# Altium footprint library PCB SOM AM625.PcbLib: 64 footprints (part 1 of 4)
Each footprint in its own frame and in the unit in brackets; x right, y up, seen from the top. Pads: shape width x height; smd on the part's side, far side on the other; paste and mask are expansions set on the pad; w line width, h text height; cw(c..) or ccw(c..) is an arc to the next point about the centre after c.
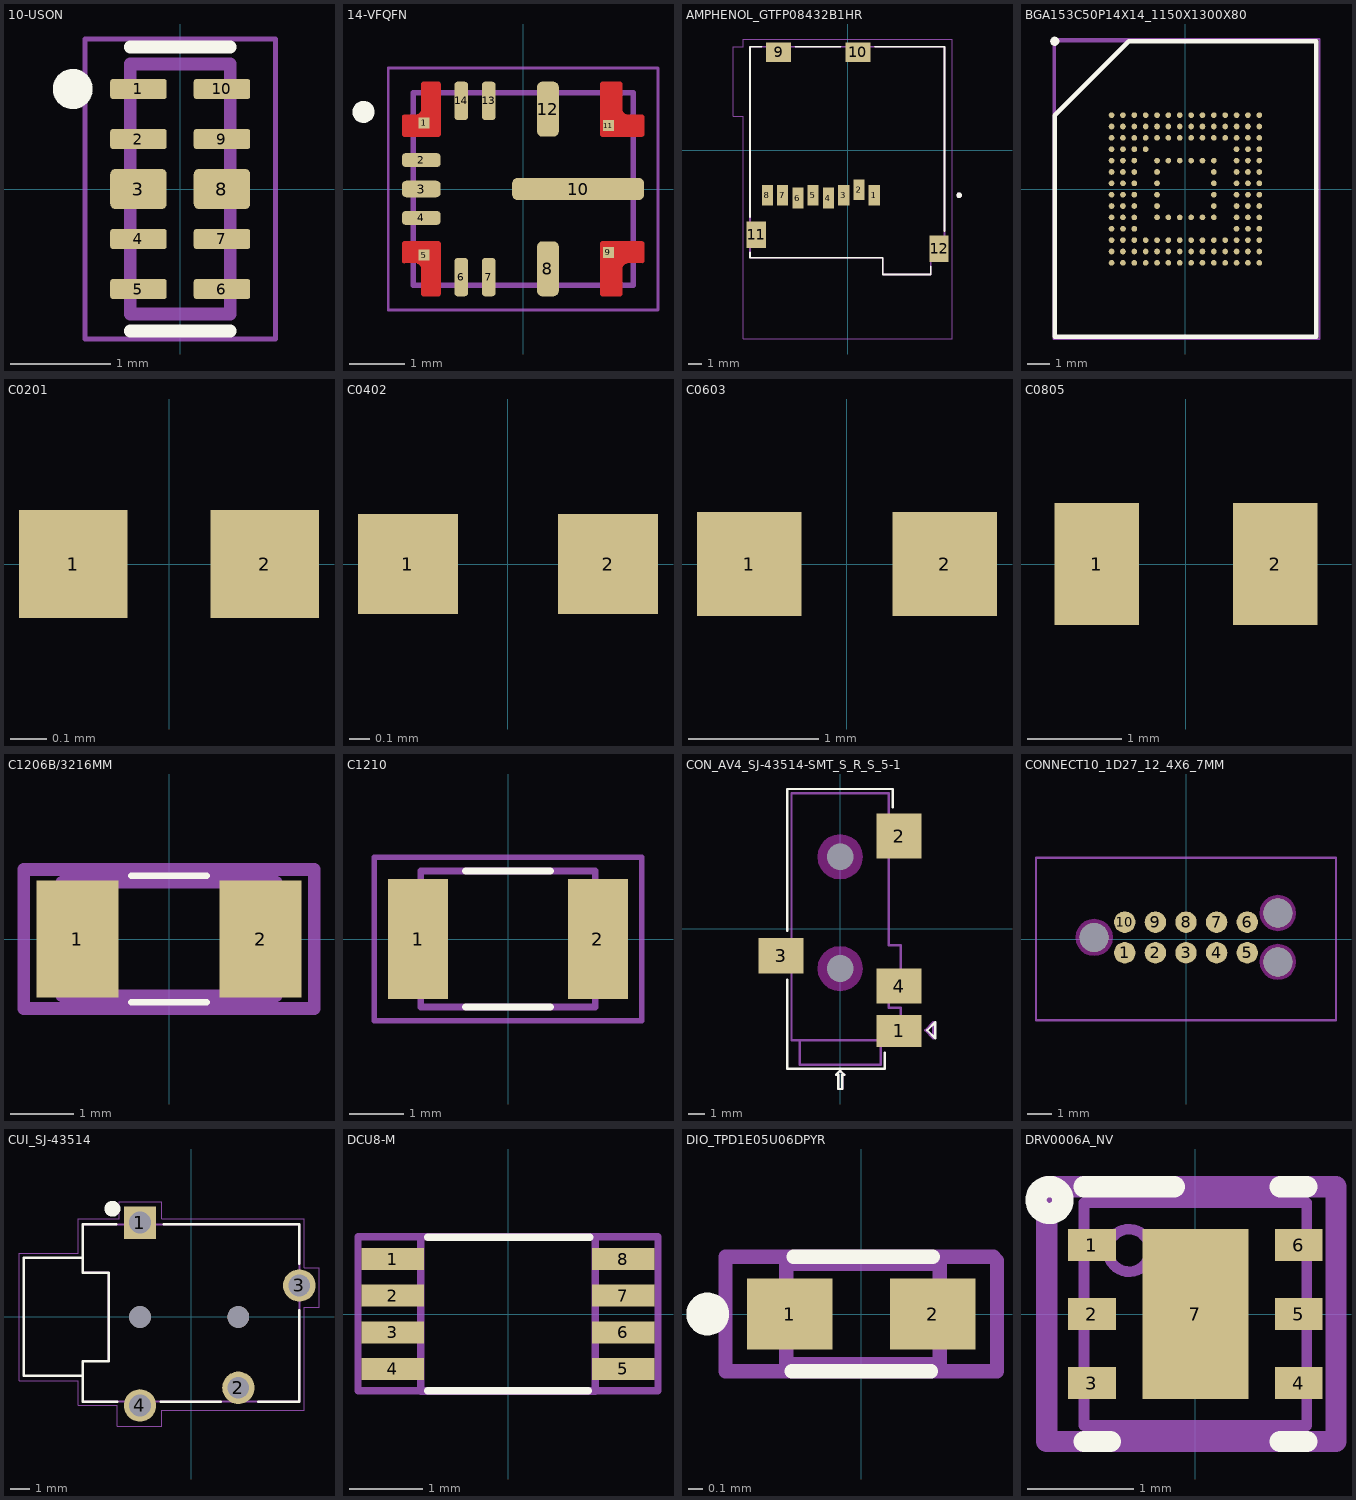
[diagram p0: the footprints below, top view; thin cyan lines are the x and y axes]

## 10-USON [mm]
height 0.55
pads (10):
  rrect25% 0.565x0.2 smd mask+0: 1(-0.417,1) 2(-0.417,0.5) 4(-0.417,-0.5) 5(-0.417,-1) 6(0.417,-1) 7(0.417,-0.5) 9(0.417,0.5) 10(0.417,1)
  rrect25% 0.565x0.4 smd paste-1 mask+0: 3(-0.417,0) 8(0.417,0)
Top Overlay:
  circle w0.2: c-1.075,1 r0.1
  lines w0.127: -0.5,-1.42 0.5,-1.42 ; -0.5,1.42 0.5,1.42
Top Paste:
  drawing of 2 lines, arcs and shapes, not listed
Top Solder:
  drawing of 10 lines, arcs and shapes, not listed
Top CMT:
  lines w0.05: -0.95,-1.5 -0.95,1.5 0.95,1.5 0.95,-1.5 -0.95,-1.5
Top ASM:
  lines w0.127: -0.5,-1.25 -0.5,1.25 0.5,1.25 0.5,-1.25 -0.5,-1.25
3D body "step_temp.STEP": height 0.55, standoff 0, extent -0.5,-1.25 0.5,1.25

## 14-VFQFN [mm]
pads (14):
  rect 0.2x0.2 smd paste-1 mask+0: 1(-1.8,1.2) 5(-1.8,-1.2) 9(1.55,-1.15) 11(1.55,1.15)
  rrect50% 0.7x0.25 smd mask+0: 2(-1.85,0.525) 4(-1.85,-0.525)
  rrect50% 0.7x0.3 smd mask+0: 3(-1.85,0)
  rrect50% 0.25x0.7 smd mask+0: 6(-1.125,-1.6) 7(-0.625,-1.6) 13(-0.625,1.6) 14(-1.125,1.6)
  rrect50% 0.4x1 smd mask+0: 8(0.45,-1.45) 12(0.45,1.45)
  rrect50% 2.4x0.4 smd paste-2 mask+0: 10(1,0)
Top Layer:
  region: 186 vertices and 0 holes, not listed, extent 1.4,-1.95 2.2,-0.95
  region: 186 vertices and 0 holes, not listed, extent 1.4,0.95 2.2,1.95
  region: 186 vertices and 0 holes, not listed, extent -2.2,-1.95 -1.5,-0.95
  region: 186 vertices and 0 holes, not listed, extent -2.2,0.95 -1.5,1.95
Top Overlay:
  circle w0.2: c-2.9,1.4 r0.1
Top Paste:
  drawing of 6 lines, arcs and shapes, not listed
Top Solder:
  drawing of 14 lines, arcs and shapes, not listed
Mechanical 15:
  lines w0.05: -2.45,-2.2 2.45,-2.2 2.45,2.2 -2.45,2.2 -2.45,-2.2
Top ASM:
  circle w0.1: c-2.9,1.4 r0.1
  lines w0.1: -2,-1.75 2,-1.75 2,1.75 -2,1.75 -2,-1.75
3D body "LM61460AANQRJRRQ1.step": height 1, standoff 0, extent -2,-1.75 2,1.75

## AMPHENOL_GTFP08432B1HR [mm]
height 1.85
pads (12):
  rect 0.8x1.5 smd: 1(1.915,-3.225) 2(0.815,-2.825) 3(-0.285,-3.225) 4(-1.385,-3.425) 5(-2.485,-3.225) 6(-3.585,-3.425) 7(-4.685,-3.225) 8(-5.785,-3.225)
  rect 1.8x1.4 smd: 9(-4.975,7.075) 10(0.725,7.075)
  rect 1.4x1.9 smd: 11(-6.575,-6.075) 12(6.575,-7.075)
Top Overlay:
  circle w0.2: c8.025,-3.225 r0.1
  lines w0.127: -7.025,-7.345 -7.025,-7.725 2.525,-7.725 2.525,-8.925 5.975,-8.925 5.975,-8.345 ; -7.025,-4.805 -7.025,7.475 -6.195,7.475 ; -3.755,7.475 -0.495,7.475 ; 1.945,7.475 6.975,7.475 6.975,-5.805
Mechanical 13:
  circle w0.2: c8.025,-3.225 r0.1
  lines w0.127: -7.025,-7.725 -7.025,7.475 6.975,7.475 6.975,-7.725 5.975,-7.725 5.975,-8.925 2.525,-8.925 2.525,-7.725 -7.025,-7.725
Mechanical 15:
  lines w0.05: -8.225,2.475 -8.225,7.475 -7.525,7.475 -7.525,8.025 7.525,8.025 7.525,-13.575 -7.525,-13.575 -7.525,2.475 -8.225,2.475
3D body "step_temp.STEP": height 1.92, standoff 0, extent -7.239,-8.897 7.181,7.553

## BGA153C50P14X14_1150X1300X80 [mm]
height 5.08
pads (153):
  round 0.25 smd mask+0.05: A1(-3.25,3.25) A2(-2.75,3.25) A3(-2.25,3.25) A4(-1.75,3.25) A5(-1.25,3.25) A6(-0.75,3.25) A7(-0.25,3.25) A8(0.25,3.25) A9(0.75,3.25) A10(1.25,3.25) A11(1.75,3.25) A12(2.25,3.25) A13(2.75,3.25) A14(3.25,3.25) B1(-3.25,2.75) B2(-2.75,2.75) B3(-2.25,2.75) B4(-1.75,2.75) B5(-1.25,2.75) B6(-0.75,2.75) B7(-0.25,2.75) B8(0.25,2.75) B9(0.75,2.75) B10(1.25,2.75) B11(1.75,2.75) B12(2.25,2.75) B13(2.75,2.75) B14(3.25,2.75) C1(-3.25,2.25) C2(-2.75,2.25) C3(-2.25,2.25) C4(-1.75,2.25) C5(-1.25,2.25) C6(-0.75,2.25) C7(-0.25,2.25) C8(0.25,2.25) C9(0.75,2.25) C10(1.25,2.25) C11(1.75,2.25) C12(2.25,2.25) C13(2.75,2.25) C14(3.25,2.25) D1(-3.25,1.75) D2(-2.75,1.75) D3(-2.25,1.75) D4(-1.75,1.75) D12(2.25,1.75) D13(2.75,1.75) D14(3.25,1.75) E1(-3.25,1.25) E2(-2.75,1.25) E3(-2.25,1.25) E5(-1.25,1.25) E6(-0.75,1.25) E7(-0.25,1.25) E8(0.25,1.25) E9(0.75,1.25) E10(1.25,1.25) E12(2.25,1.25) E13(2.75,1.25) E14(3.25,1.25) F1(-3.25,0.75) F2(-2.75,0.75) F3(-2.25,0.75) F5(-1.25,0.75) F10(1.25,0.75) F12(2.25,0.75) F13(2.75,0.75) F14(3.25,0.75) G1(-3.25,0.25) G2(-2.75,0.25) G3(-2.25,0.25) G5(-1.25,0.25) G10(1.25,0.25) G12(2.25,0.25) G13(2.75,0.25) G14(3.25,0.25) H1(-3.25,-0.25) H2(-2.75,-0.25) H3(-2.25,-0.25) H5(-1.25,-0.25) H10(1.25,-0.25) H12(2.25,-0.25) H13(2.75,-0.25) H14(3.25,-0.25) J1(-3.25,-0.75) J2(-2.75,-0.75) J3(-2.25,-0.75) J5(-1.25,-0.75) J10(1.25,-0.75) J12(2.25,-0.75) J13(2.75,-0.75) J14(3.25,-0.75) K1(-3.25,-1.25) K2(-2.75,-1.25) K3(-2.25,-1.25) K5(-1.25,-1.25) K6(-0.75,-1.25) K7(-0.25,-1.25) K8(0.25,-1.25) K9(0.75,-1.25) K10(1.25,-1.25) K12(2.25,-1.25) K13(2.75,-1.25) K14(3.25,-1.25) L1(-3.25,-1.75) L2(-2.75,-1.75) L3(-2.25,-1.75) L12(2.25,-1.75) L13(2.75,-1.75) L14(3.25,-1.75) M1(-3.25,-2.25) M2(-2.75,-2.25) M3(-2.25,-2.25) M4(-1.75,-2.25) M5(-1.25,-2.25) M6(-0.75,-2.25) M7(-0.25,-2.25) M8(0.25,-2.25) M9(0.75,-2.25) M10(1.25,-2.25) M11(1.75,-2.25) M12(2.25,-2.25) M13(2.75,-2.25) M14(3.25,-2.25) N1(-3.25,-2.75) N2(-2.75,-2.75) N3(-2.25,-2.75) N4(-1.75,-2.75) N5(-1.25,-2.75) N6(-0.75,-2.75) N7(-0.25,-2.75) N8(0.25,-2.75) N9(0.75,-2.75) N10(1.25,-2.75) N11(1.75,-2.75) N12(2.25,-2.75) N13(2.75,-2.75) N14(3.25,-2.75) P1(-3.25,-3.25) P2(-2.75,-3.25) P3(-2.25,-3.25) P4(-1.75,-3.25) P5(-1.25,-3.25) P6(-0.75,-3.25) P7(-0.25,-3.25) P8(0.25,-3.25) P9(0.75,-3.25) P10(1.25,-3.25) P11(1.75,-3.25) P12(2.25,-3.25) P13(2.75,-3.25) P14(3.25,-3.25)
Top Overlay:
  circle w0.2: c-5.75,6.5 r0.1
  lines w0.2: -5.75,-6.5 5.75,-6.5 5.75,6.5 -2.5,6.5 -5.75,3.25 -5.75,-6.5
Top CMT:
  lines w0.1: -5.8,-6.6 -5.8,6.6 5.9,6.6 5.9,-6.6 -5.8,-6.6
Top ASM:
  lines w0.1: -5.75,3.225 -2.475,6.5 ; -5.75,-6.5 5.75,-6.5 5.75,6.5 -5.75,6.5 -5.75,-6.5
3D body "KLMAG1JETD-B041.stp": height 0.8, standoff 0, extent -5.75,-6.5 5.75,6.5

## C0201 [mm]
pads (2):
  rect 0.3x0.3 smd mask+0.04: 1(-0.265,0) 2(0.265,0)
Top ASM:
  text ".Designator" at -2.286,-0.254 h1
3D body "C0201.step": height 0.3, standoff 0, extent -0.3,-0.15 0.3,0.15

## C0402 [mm]
pads (2):
  rect 0.5x0.5 smd: 1(-0.5,0) 2(0.5,0)
Top ASM:
  text ".Designator" at -2.35,-0.25 h1
3D body "CAPC1005X56N EIA 0402.step": height 0.56, standoff 0, extent -0.5,-0.25 0.5,0.25

## C0603 [mm]
pads (2):
  rect 0.8x0.8 smd: 1(-0.75,0) 2(0.75,0)
Top ASM:
  text ".Designator" at -2.35,-0.26 h1
3D body "C0603.step": height 0.95, standoff 0.15, extent -0.8,-0.425 0.8,0.435
3D body "C0603.step": height 0.79, standoff 0, extent -0.8,-0.425 0.8,0.435

## C0805 [mm]
pads (2):
  rect 0.9x1.3 smd: 1(-0.95,0) 2(0.95,0)
Top ASM:
  text ".Designator" at -2.28,-0.27 h1
3D body "CAPC2012X95N EIA 0805.step": height 1.5, standoff 0.55, extent -1,-0.6 1,0.6
3D body "CAPC2012X95N EIA 0805.step": height 0.95, standoff 0, extent -1,-0.6 1,0.6

## C1206B/3216MM [mm] "Chip Capacitor, 2-Leads, Body 3.2x1.6mm, IPC Medium Density"
height 1.35
pads (2):
  rect 1.3x1.85 smd: 1(-1.45,0) 2(1.45,0)
Top Overlay:
  lines w0.1: -0.6,-1 0.6,-1 ; -0.6,1 0.6,1
Top CMT:
  lines w0.2: -2.3,-1.1 2.3,-1.1 2.3,1.1 -2.3,1.1 -2.3,-1.1
  text ".Comment" at -2.1,-0.5 h0.6
Top ASM:
  lines w0.2: -1.7,-0.9 1.7,-0.9 1.7,0.9 -1.7,0.9 -1.7,-0.9
  text "'.Designator'" at -2.325,-0.55 h0.6
3D body "1206cap_1206-1.STEP": height 1.6, standoff 0, extent -1.6,-0.8 1.6,0.8

## C1210 [mm]
height 2.8
pads (2):
  rect 1.1x2.2 smd: 1(-1.65,0) 2(1.65,0)
Top Overlay:
  lines w0.127: -0.78,-1.25 0.78,-1.25 ; -0.78,1.25 0.78,1.25
Top CMT:
  lines w0.1: -2.45,-1.5 2.45,-1.5 2.45,1.5 -2.45,1.5 -2.45,-1.5
  text ".Comment" at -1.276,-0.151 h0.6
Top ASM:
  lines w0.127: -1.6,-1.25 1.6,-1.25 1.6,1.25 -1.6,1.25 -1.6,-1.25
  text "'.Designator'" at -1.6,-0.2 h0.6
3D body "step_temp.STEP": height 2.85, standoff 0, extent -1.6,-1.25 1.6,1.25

## CON_AV4_SJ-43514-SMT_S_R_S_5-1 [mil] "CON_AV4_SJ-43514-SMT_S_R_S_5-1"
pads (6):
  rect 111x79 smd: 1(145.67,-251.38)
  rect 111x111 smd: 2(145.67,228.94)
  rect 111x87 smd: 3(-145.67,-66.34) 4(145.67,-141.14)
  round 61 hole 66 unplated: ""(0,-97.84) ""(0,177.76)
Top Overlay:
  lines w6: -130,-125 -130,-345 110,-345 110,-305 ; -130,-5 -130,345 130,345 130,300 ; -10,-360 0,-350 10,-360 5,-360 5,-395 -5,-395 -5,-360 -10,-360 ; 215,-250 235,-230 235,-270 215,-250
Multi-Layer keep-out:
  region: 0,122.28 14.36,124.17 27.74,129.71 39.23,138.53 48.05,150.02 53.59,163.4 55.48,177.75 53.59,192.11 48.05,205.49 39.23,216.99 27.74,225.8 14.36,231.34 0,233.23 -14.36,231.34 -27.74,225.8 -39.23,216.99 -48.05,205.49 -53.59,192.11 -55.48,177.75 -53.59,163.4 -48.05,150.02 -39.23,138.53 -27.74,129.71 -14.36,124.17
  region: 0,-153.31 14.36,-151.42 27.74,-145.88 39.23,-137.06 48.05,-125.57 53.59,-112.19 55.48,-97.83 53.59,-83.48 48.05,-70.1 39.23,-58.6 27.74,-49.79 14.36,-44.25 0,-42.36 -14.36,-44.25 -27.74,-49.79 -39.23,-58.6 -48.05,-70.1 -53.59,-83.48 -55.48,-97.83 -53.59,-112.19 -48.05,-125.57 -39.23,-137.06 -27.74,-145.88 -14.36,-151.42
Mechanical 49:
  text "1" at 145.67,-257.38 h10
  text "2" at 145.67,227.94 h10
  text "4" at 145.67,-147.14 h10
  text "3" at -150,-66 h10
Top Assembly (Mech50):
  lines w6: 100,-275 -100,-275 -100,-335 100,-335 100,-275 ; 100,-275 120,-275 120,-235 150,-235 150,-195 120,-195 120,-120 150,-120 150,-40 120,-40 120,335 -120,335 -120,-275 100,-275 ; -10,-360 0,-350 10,-360 5,-360 5,-395 -5,-395 -5,-360 -10,-360 ; 210,-250 230,-230 230,-270 210,-250
3D body "CUI_DEVICES_SJ-43514-SMT-TR.step": height 216.54, standoff -19.69, extent -177.16,-337.2 177.17,337.2

## CONNECT10_1D27_12_4X6_7MM [mm] "CONNECT10_1D27_12_4X6_7MM"
pads (13):
  round 0.89 smd: 1(-2.54,-0.572) 2(-1.27,-0.572) 3(0,-0.572) 4(1.27,-0.572) 5(2.54,-0.572) 6(2.54,0.699) 7(1.27,0.699) 8(0,0.699) 9(-1.27,0.699) 10(-2.54,0.699)
  round 1.2 hole 1.2 unplated: ""(-3.81,0.064) ""(3.81,-0.951) ""(3.81,1.078)
Multi-Layer keep-out:
  region: -4.579,0.064 -4.552,-0.135 -4.476,-0.321 -4.353,-0.48 -4.194,-0.602 -4.009,-0.679 -3.81,-0.705 -3.611,-0.679 -3.426,-0.602 -3.267,-0.48 -3.144,-0.321 -3.068,-0.135 -3.041,0.064 -3.068,0.262 -3.144,0.448 -3.267,0.607 -3.426,0.729 -3.611,0.806 -3.81,0.832 -4.009,0.806 -4.194,0.729 -4.353,0.607 -4.476,0.448 -4.552,0.262
  region: 3.062,1.078 3.088,0.885 3.162,0.705 3.281,0.55 3.436,0.431 3.616,0.356 3.81,0.331 4.004,0.356 4.184,0.431 4.339,0.55 4.458,0.705 4.532,0.885 4.558,1.078 4.532,1.272 4.458,1.452 4.339,1.607 4.184,1.726 4.004,1.801 3.81,1.826 3.616,1.801 3.436,1.726 3.281,1.607 3.162,1.452 3.088,1.272
  region: 3.064,-0.951 3.089,-1.145 3.164,-1.325 3.282,-1.479 3.437,-1.598 3.617,-1.672 3.81,-1.698 4.003,-1.672 4.183,-1.598 4.338,-1.479 4.456,-1.325 4.531,-1.145 4.556,-0.951 4.531,-0.758 4.456,-0.578 4.338,-0.424 4.183,-0.305 4.003,-0.231 3.81,-0.205 3.617,-0.231 3.437,-0.305 3.282,-0.424 3.164,-0.578 3.089,-0.758
Top ASM:
  lines w0.1: -6.223,-3.365 -6.223,3.365 6.223,3.365 6.223,-3.365 -6.223,-3.365
3D body "TAG_CONNECT_TC2050-IDC.STEP": height 29.28, standoff -2.99, extent -6.198,-4.173 6.248,4.173

## CUI_SJ-43514 [mm]
pads (6):
  rect 1.65x1.65 / inner round 1.65 / far side rect 1.65x1.65 hole 1.1: 1(-2.6,4.8)
  round 1.65 hole 1.1: 2(2.4,-3.6) 3(5.5,1.6) 4(-2.6,-4.5)
  round 1.1 hole 1.1 unplated: ""(-2.6,0) ""(2.4,0)
Top Overlay:
  circle w0.4: c-4,5.5 r0.2
  lines w0.127: -3.8,4.7 -5.5,4.7 -5.5,3 ; -3.75,-4.3 -5.5,-4.3 -5.5,-3 ; -1.55,-4.3 1.5,-4.3 ; -1.4,4.7 5.5,4.7 5.5,2.7 ; 3.4,-4.3 5.5,-4.3 5.5,0.35 ; -5.5,-3 -5.5,-2.25 -4.2,-2.25 -4.2,2.25 -5.5,2.25 -5.5,3 ; -5.5,-3 -8.5,-3 -8.5,3 -5.5,3
Mechanical 1:
  lines w0: -5.5,-2.25 -4.2,-2.25 -4.2,2.25 -5.5,2.25
Mechanical 15:
  lines w0.05: -8.75,-3.25 -5.75,-3.25 -5.75,-4.5 -3.75,-4.5 -3.75,-5.55 -1.5,-5.55 -1.5,-4.75 5.75,-4.75 5.75,0.5 6.5,0.5 6.5,2.5 5.75,2.5 5.75,5 -1.5,5 -1.5,5.85 -3.65,5.85 -3.65,5 -5.75,5 -5.75,3.25 -8.75,3.25 -8.75,-3.25
Top ASM:
  lines w0.1: -5.5,-3 -5.5,-2.25 -4.2,-2.25 -4.2,2.25 -5.5,2.25 -5.5,3 ; -5.5,-3 -5.5,-4.3 5.5,-4.3 5.5,4.7 -5.5,4.7 -5.5,3 ; -5.5,-3 -8.5,-3 -8.5,3 -5.5,3
3D body "CUI_DEVICES_SJ-43514.step": height 6, standoff -1.25, extent -8.016,-5.207 5.984,4.993

## DCU8-M [mm]
pads (8):
  rect 0.85x0.3 smd paste+0 mask+0: 1(-1.576,0.75) 2(-1.576,0.25) 3(-1.576,-0.25) 4(-1.576,-0.75) 5(1.576,-0.75) 6(1.576,-0.25) 7(1.576,0.25) 8(1.576,0.75)
Top Overlay:
  lines w0.1: -1.1,-1.05 1.1,-1.05 ; -1.1,1.05 1.117,1.05
Top CMT:
  lines w0.1: -2.05,-1.05 2.05,-1.05 2.05,1.054 -2.05,1.054 -2.05,-1.05
  text ".Comment" at -1.1,-0.075 h0.6
Top ASM:
  lines w0.1: -1.194,-0.877 -1.194,-0.623 ; -1.194,-0.377 -1.194,-0.123 ; -1.194,0.123 -1.194,0.377 ; -1.194,0.623 -1.194,0.877 ; 1.194,-0.877 1.194,-0.623 ; 1.194,-0.377 1.194,-0.123 ; 1.194,0.123 1.194,0.377 ; 1.194,0.623 1.194,0.877 ; -1.194,-1.054 1.194,-1.054 1.194,1.054 -1.194,1.054 -1.194,-1.054
  text "'.Designator'" at -1.5,-0.075 h0.6
3D body "DCU8.step": height 0.89, standoff 0, extent -1.6,-1.054 1.6,1.054

## DIO_TPD1E05U06DPYR [mm]
pads (2):
  rect 0.6x0.5 smd: 1(-0.5,0) 2(0.5,0)
Top Overlay:
  circle w0.15: c-1.075,0 r0.075
  lines w0.1: -0.487,-0.4 0.487,-0.4 ; -0.475,0.4 0.5,0.4
Top CMT:
  lines w0.1: -0.95,-0.4 0.95,-0.4 0.95,0.375 0.925,0.4 -0.95,0.4 -0.95,-0.4
  text ".Comment" at -0.7,-0.25 h0.6
Top ASM:
  lines w0.1: -0.525,-0.35 -0.525,0.35 0.55,0.35 0.55,-0.35 -0.525,-0.35
  text "'.Designator'" at -1.3,-0.25 h0.6
3D body "DPY2_TEX.step": height 0.4, standoff 0, extent -0.55,-0.35 0.55,0.35

## DRV0006A_NV [mm]
pads (7):
  rect 0.45x0.3 smd paste+0 mask+0.051: 1(-0.975,0.65) 2(-0.975,0) 3(-0.975,-0.65) 4(0.975,-0.65) 5(0.975,0) 6(0.975,0.65)
  rect 1x1.6 smd paste-0.5 mask+0.051: 7(0,0)
Top Overlay:
  circle w0.2: c-1.375,1.075 r0.127
  lines w0.2: -1.05,-1.2 -0.8,-1.2 ; -1.05,1.2 -0.2,1.2 ; 0.8,-1.2 1.05,-1.2 ; 0.8,1.2 1.05,1.2
Top Paste:
  region: -0.499,0.139 -0.5,0.149 -0.5,0.751 -0.499,0.761 -0.496,0.77 -0.492,0.778 -0.486,0.786 -0.478,0.792 -0.47,0.796 -0.461,0.799 -0.451,0.8 0.451,0.8 0.461,0.799 0.47,0.796 0.478,0.792 0.486,0.786 0.492,0.778 0.496,0.77 0.499,0.761 0.5,0.751 0.5,0.149 0.499,0.139 0.496,0.13 0.492,0.122 0.486,0.114 0.478,0.108 0.47,0.104 0.461,0.101 0.451,0.1 -0.451,0.1 -0.461,0.101 -0.47,0.104 -0.478,0.108 -0.486,0.114 -0.492,0.122 -0.496,0.13
  region: -0.499,-0.761 -0.5,-0.751 -0.5,-0.149 -0.499,-0.139 -0.496,-0.13 -0.492,-0.122 -0.486,-0.114 -0.478,-0.108 -0.47,-0.104 -0.461,-0.101 -0.451,-0.1 0.451,-0.1 0.461,-0.101 0.47,-0.104 0.478,-0.108 0.486,-0.114 0.492,-0.122 0.496,-0.13 0.499,-0.139 0.5,-0.149 0.5,-0.751 0.499,-0.761 0.496,-0.77 0.492,-0.778 0.486,-0.786 0.478,-0.792 0.47,-0.796 0.461,-0.799 0.451,-0.8 -0.451,-0.8 -0.461,-0.799 -0.47,-0.796 -0.478,-0.792 -0.486,-0.786 -0.492,-0.778 -0.496,-0.77
Mechanical 13:
  circle w0.1: c-0.625,0.6 r0.2
  lines w0.1: -1.05,-1.05 -1.05,1.05 1.05,1.05 1.05,-1.05 -1.05,-1.05
Top CMT:
  lines w0.2: -1.4,-1.2 1.325,-1.2 1.325,1.2 -1.4,1.2 -1.4,-1.2
3D body "DRV6.step": height 0.75, standoff -0.05, extent -1.01,-1.01 1.01,1.01